# Altium integrated library LEMO Unipole And Multipole Type Connectors.IntLib: 1566 symbols (part 2 of 13)
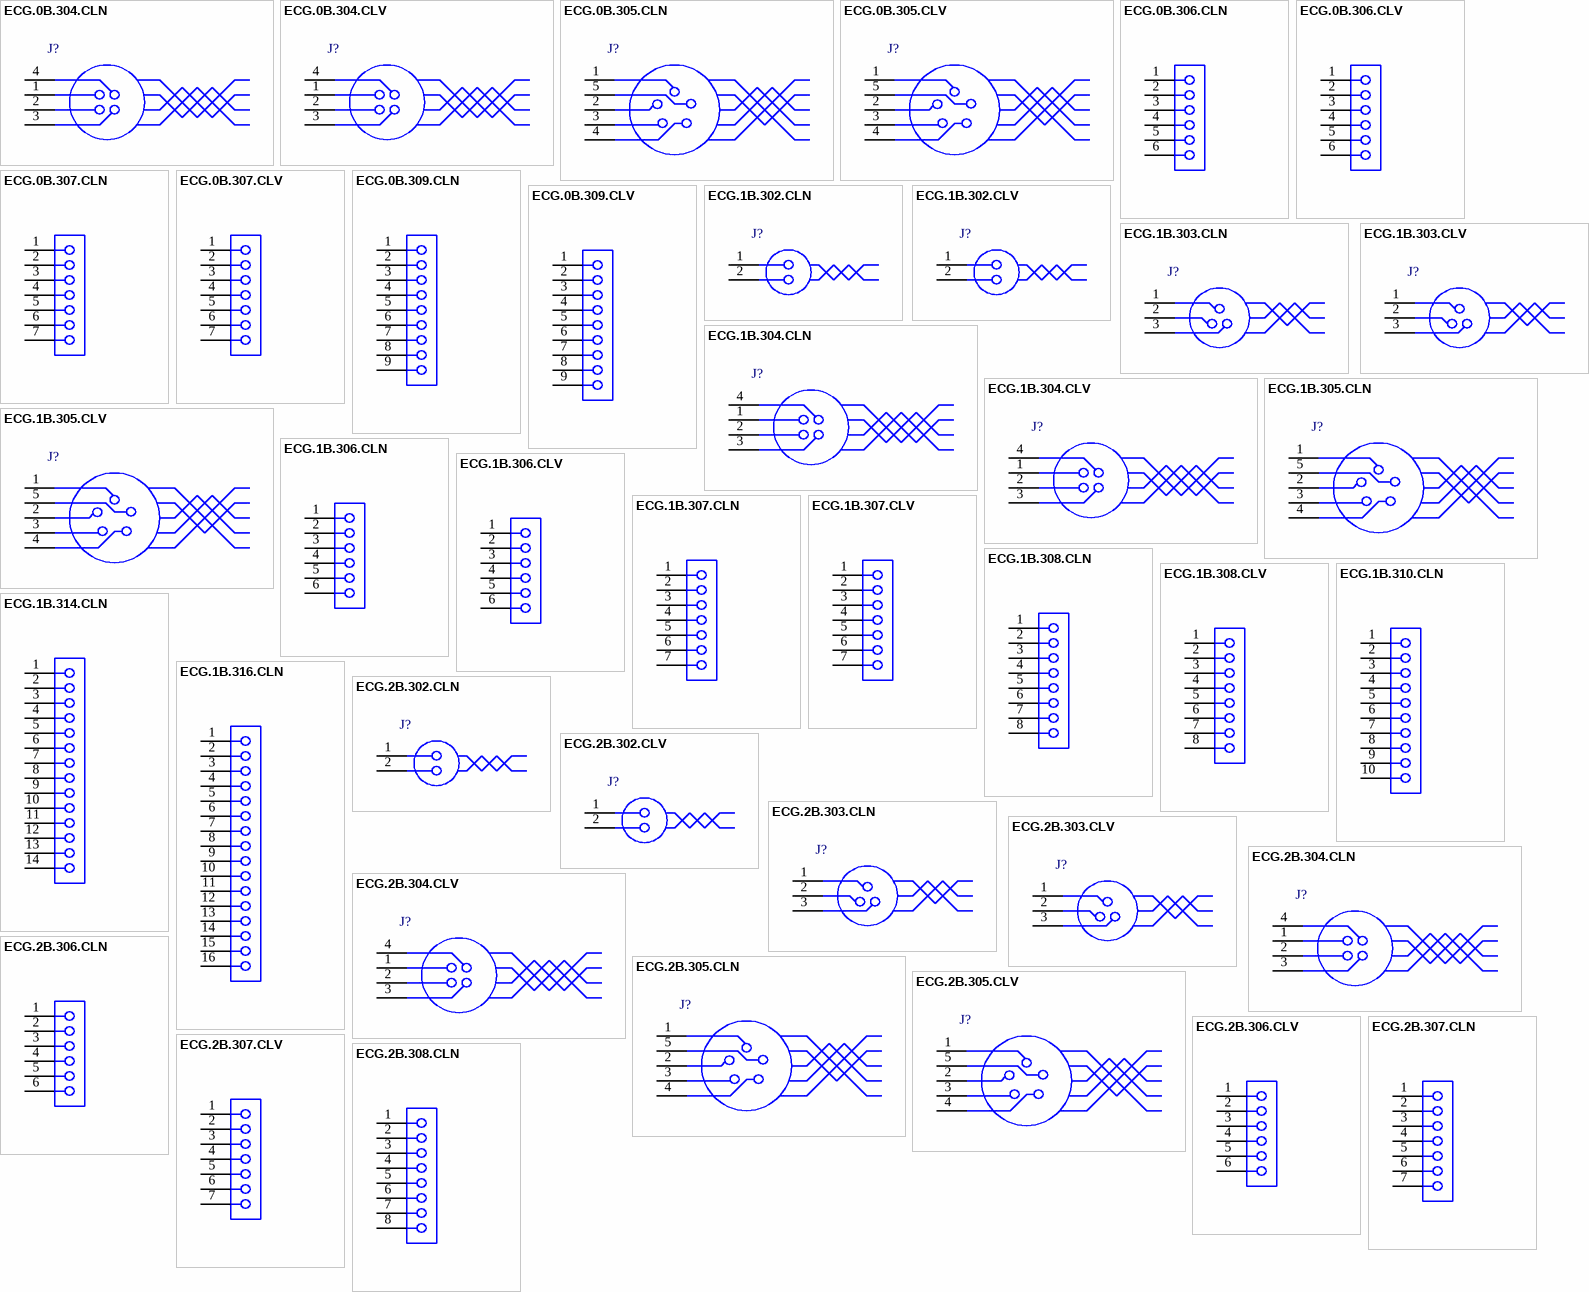
[diagram p44: symbols ECG.0B.304.CLN to ECG.2B.308.CLN]

## ECG.2B.308.CLN
designator J?
Fixed receptacle with two nuts and straight contact for printed circuit (back panel mounting), Key (G), 2B series, Multipole Type with 8 Contacts; Manufacturer: LEMO; PartNumber: ECG.2B.308.CLN; Number of contacts: 8; Contact Diameter: 0.9 mm; AWG: 22; Rated Current(A): 10; DatasheetVersion: Jun-14; PackageReference: ECG.2B.308.CLN; PackageDescription: Fixed receptacle with two nuts and straight contact for printed circuit (back panel mounting), Key(G) for Printed Circuit; Supplier 1: Mouser; Supplier Part Number 1: 736-ECG2B308CLN; Supplier 2: Digi-Key; Supplier Part Number 2: ECG.2B.308.CLN-ND; ComponentLink1Description: Manufacturer URL; ComponentLink1URL: http://www.lemo.com; ComponentLink2Description: Datasheet; ComponentLink2URL: http://intra.lemo.ch/catalog/ROW/UK_English/unipole_multipole.pdf
footprint ECG.2B.308.CLN (Socket, Female, Body 15mm dia. Height 21.8 mm, Through hole)
pins: 1, 2, 3, 4, 5, 6, 7, 8

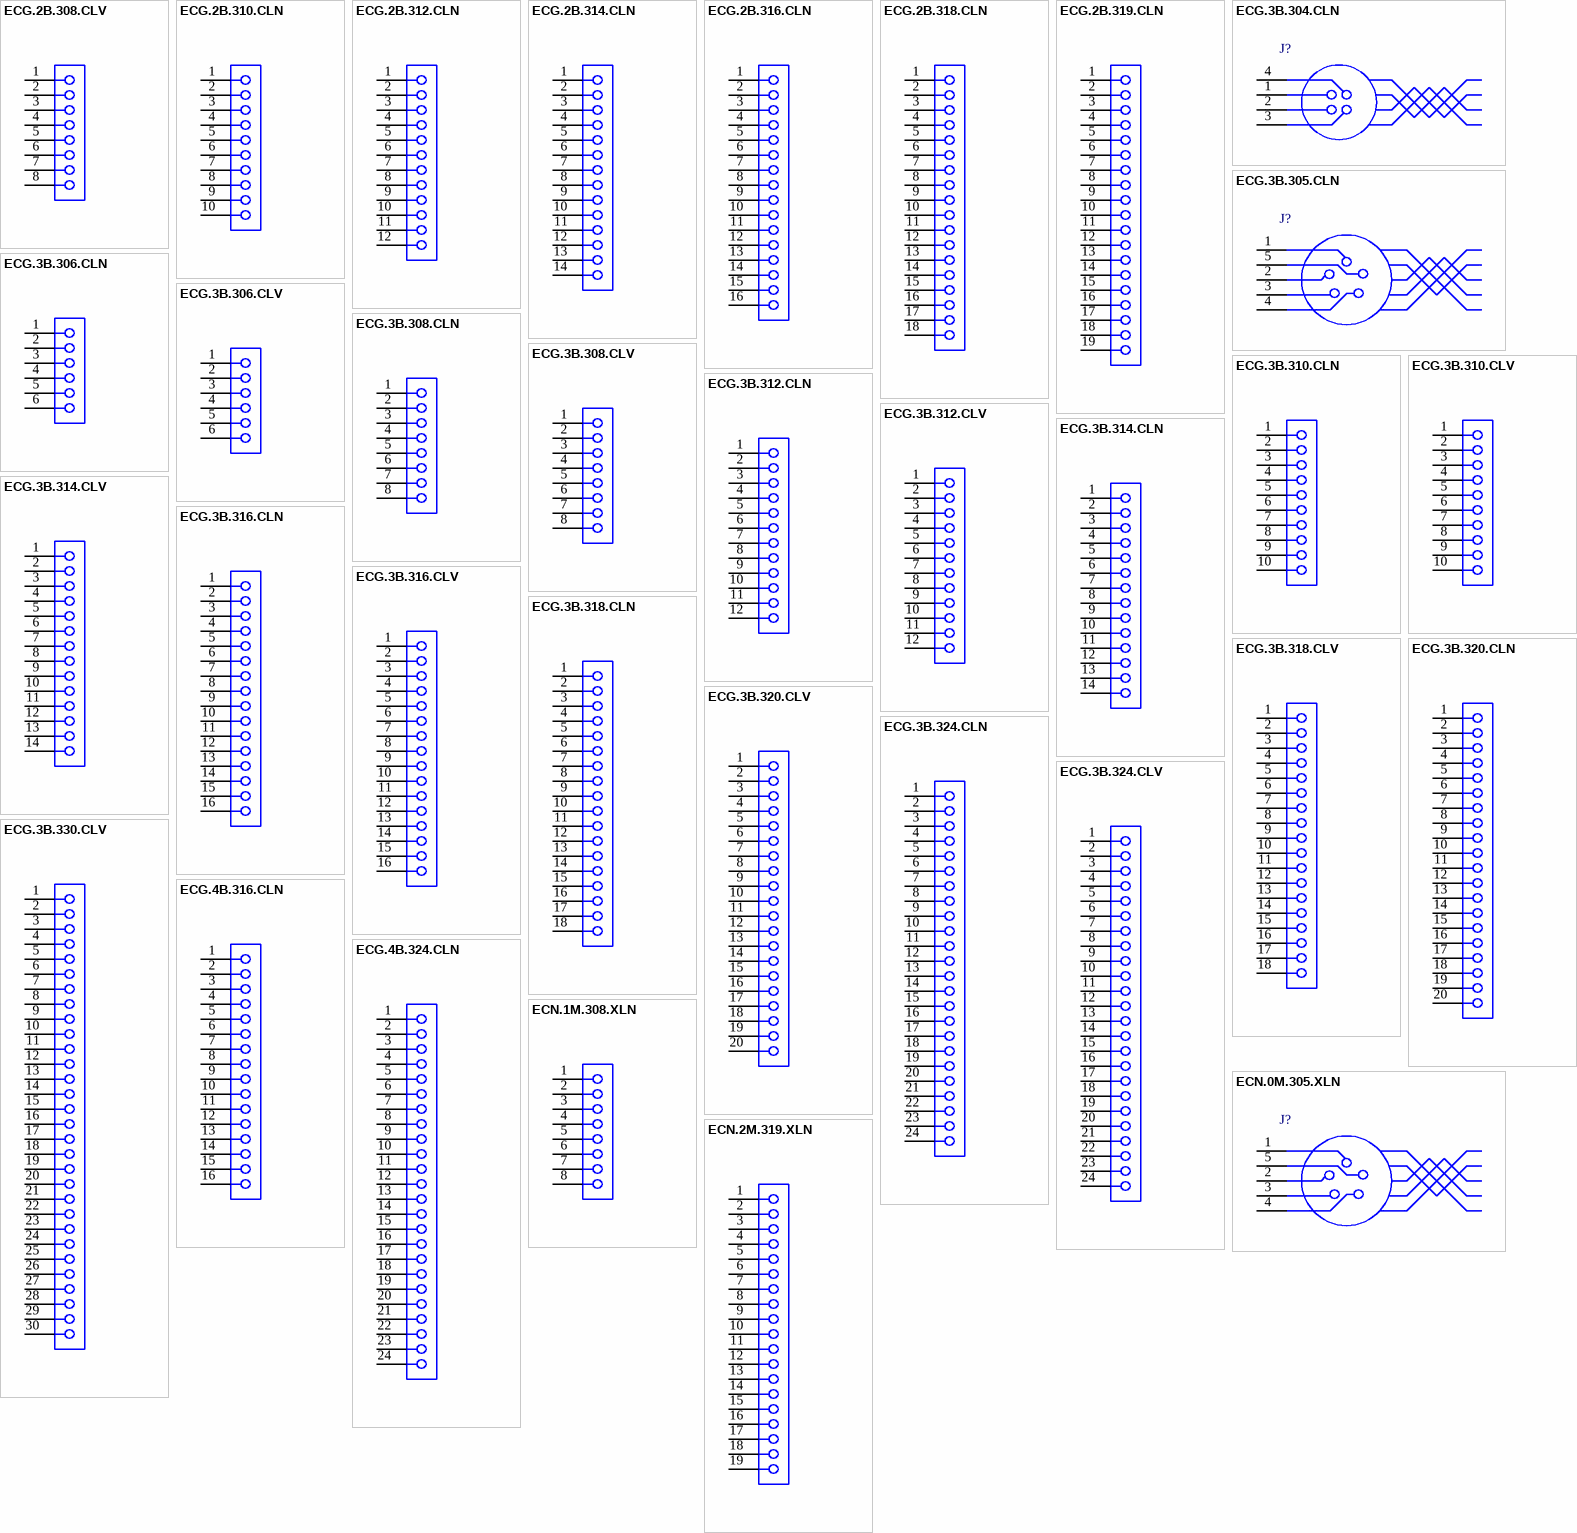
[diagram p3: symbols ECG.2B.308.CLV to ECN.2M.319.XLN]

## ECG.2B.308.CLV
designator J?
Fixed receptacle with two nuts, with elbow contact for printed circuit (back panel mounting), Key (G), 2B series, Multipole Type with 8 Contacts; Manufacturer: LEMO; PartNumber: ECG.2B.308.CLV; Number of contacts: 8; Contact Diameter: 0.9 mm; AWG: 22; Rated Current(A): 6; DatasheetVersion: Jun-14; PackageReference: ECG.2B.308.CLV; PackageDescription: Fixed receptacle with two nuts, with elbow contact for printed circuit (back panel mounting), Key(G) for Printed Circuit; Supplier 1: Mouser; Supplier Part Number 1: 736-ECG2B308CLV; Supplier 2: Digi-Key; Supplier Part Number 2: ECG.2B.308.CLV-ND; ComponentLink1Description: Manufacturer URL; ComponentLink1URL: http://www.lemo.com; ComponentLink2Description: Datasheet; ComponentLink2URL: http://intra.lemo.ch/catalog/ROW/UK_English/unipole_multipole.pdf
footprint ECG.2B.308.CLV (Socket, Female, Body 15mm dia. Height 22.3 mm, Through hole)
pins: 1, 2, 3, 4, 5, 6, 7, 8

## ECG.2B.310.CLN
designator J?
Fixed receptacle with two nuts and straight contact for printed circuit (back panel mounting), Key (G), 2B series, Multipole Type with 10 Contacts; Manufacturer: LEMO; PartNumber: ECG.2B.310.CLN; Number of contacts: 10; Contact Diameter: 0.9 mm; AWG: 22; Rated Current(A): 8; DatasheetVersion: Jun-14; PackageReference: ECG.2B.310.CLN; PackageDescription: Fixed receptacle with two nuts and straight contact for printed circuit (back panel mounting), Key(G) for Printed Circuit; Supplier 1: Mouser; Supplier Part Number 1: 736-ECG2B310CLN; Supplier 2: Newark; Supplier Part Number 2: 39Y5113; Supplier 3: Digi-Key; Supplier Part Number 3: 1124-1329-ND; ComponentLink1Description: Manufacturer URL; ComponentLink1URL: http://www.lemo.com; ComponentLink2Description: Datasheet; ComponentLink2URL: http://intra.lemo.ch/catalog/ROW/UK_English/unipole_multipole.pdf
footprint ECG.2B.310.CLN (Socket, Female, Body 15mm dia. Height 21.8 mm, Through hole)
pins: 1, 2, 3, 4, 5, 6, 7, 8, 9, 10

## ECG.2B.312.CLN
designator J?
Fixed receptacle with two nuts and straight contact for printed circuit (back panel mounting), Key (G), 2B series, Multipole Type with 12 Contacts; Manufacturer: LEMO; PartNumber: ECG.2B.312.CLN; Number of contacts: 12; Contact Diameter: 0.7 mm; AWG: 24; Rated Current(A): 7; DatasheetVersion: Jun-14; PackageReference: ECG.2B.312.CLN; PackageDescription: Fixed receptacle with two nuts and straight contact for printed circuit (back panel mounting), Key(G) for Printed Circuit; Supplier 1: Mouser; Supplier Part Number 1: 736-ECG2B312CLN; Supplier 2: Digi-Key; Supplier Part Number 2: 1124-1330-ND; ComponentLink1Description: Manufacturer URL; ComponentLink1URL: http://www.lemo.com; ComponentLink2Description: Datasheet; ComponentLink2URL: http://intra.lemo.ch/catalog/ROW/UK_English/unipole_multipole.pdf
footprint ECG.2B.312.CLN (Socket, Female, Body 15mm dia. Height 21.8 mm, Through hole)
pins: 1, 2, 3, 4, 5, 6, 7, 8, 9, 10, 11, 12

## ECG.2B.314.CLN
designator J?
Fixed receptacle with two nuts and straight contact for printed circuit (back panel mounting), Key (G), 2B series, Multipole Type with 14 Contacts; Manufacturer: LEMO; PartNumber: ECG.2B.314.CLN; Number of contacts: 14; Contact Diameter: 0.7 mm; AWG: 24; Rated Current(A): 6.5; DatasheetVersion: Jun-14; PackageReference: ECG.2B.314.CLN; PackageDescription: Fixed receptacle with two nuts and straight contact for printed circuit (back panel mounting), Key(G) for Printed Circuit; Supplier 1: Mouser; Supplier Part Number 1: 736-ECG2B314CLN; Supplier 2: Digi-Key; Supplier Part Number 2: ECG.2B.314.CLN-ND; ComponentLink1Description: Manufacturer URL; ComponentLink1URL: http://www.lemo.com; ComponentLink2Description: Datasheet; ComponentLink2URL: http://intra.lemo.ch/catalog/ROW/UK_English/unipole_multipole.pdf
footprint ECG.2B.314.CLN (Socket, Female, Body 15mm dia. Height 21.8 mm, Through hole)
pins: 1, 2, 3, 4, 5, 6, 7, 8, 9, 10, 11, 12, 13, 14

## ECG.2B.316.CLN
designator J?
Fixed receptacle with two nuts and straight contact for printed circuit (back panel mounting), Key (G), 2B series, Multipole Type with 16 Contacts; Manufacturer: LEMO; PartNumber: ECG.2B.316.CLN; Number of contacts: 16; Contact Diameter: 0.7 mm; AWG: 24; Rated Current(A): 6; DatasheetVersion: Jun-14; PackageReference: ECG.2B.316.CLN; PackageDescription: Fixed receptacle with two nuts and straight contact for printed circuit (back panel mounting), Key(G) for Printed Circuit; Supplier 1: Mouser; Supplier Part Number 1: 736-ECG2B316CLN; Supplier 2: Digi-Key; Supplier Part Number 2: ECG.2B.316.CLN-ND; ComponentLink1Description: Manufacturer URL; ComponentLink1URL: http://www.lemo.com; ComponentLink2Description: Datasheet; ComponentLink2URL: http://intra.lemo.ch/catalog/ROW/UK_English/unipole_multipole.pdf
footprint ECG.2B.316.CLN (Socket, Female, Body 15mm dia. Height 21.8 mm, Through hole)
pins: 1, 2, 3, 4, 5, 6, 7, 8, 9, 10, 11, 12, 13, 14, 15, 16

## ECG.2B.318.CLN
designator J?
Fixed receptacle with two nuts and straight contact for printed circuit (back panel mounting), Key (G), 2B series, Multipole Type with 18 Contacts; Manufacturer: LEMO; PartNumber: ECG.2B.318.CLN; Number of contacts: 18; Contact Diameter: 0.7 mm; AWG: 24; Rated Current(A): 5.5; DatasheetVersion: Jun-14; PackageReference: ECG.2B.318.CLN; PackageDescription: Fixed receptacle with two nuts and straight contact for printed circuit (back panel mounting), Key(G) for Printed Circuit; Supplier 1: Mouser; Supplier Part Number 1: 736-ECG2B318CLN; Supplier 2: Digi-Key; Supplier Part Number 2: ECG.2B.318.CLN-ND; ComponentLink1Description: Manufacturer URL; ComponentLink1URL: http://www.lemo.com; ComponentLink2Description: Datasheet; ComponentLink2URL: http://intra.lemo.ch/catalog/ROW/UK_English/unipole_multipole.pdf
footprint ECG.2B.318.CLN (Socket, Female, Body 15mm dia. Height 21.8 mm, Through hole)
pins: 1, 2, 3, 4, 5, 6, 7, 8, 9, 10, 11, 12, 13, 14, 15, 16, 17, 18

## ECG.2B.319.CLN
designator J?
Fixed receptacle with two nuts and straight contact for printed circuit (back panel mounting), Key (G), 2B series, Multipole Type with 19 Contacts; Manufacturer: LEMO; PartNumber: ECG.2B.319.CLN; Number of contacts: 19; Contact Diameter: 0.7 mm; AWG: 24; Rated Current(A): 5; DatasheetVersion: Jun-14; PackageReference: ECG.2B.319.CLN; PackageDescription: Fixed receptacle with two nuts and straight contact for printed circuit (back panel mounting), Key(G) for Printed Circuit; Supplier 1: Mouser; Supplier Part Number 1: 736-ECG2B319CLN; Supplier 2: Digi-Key; Supplier Part Number 2: ECG.2B.319.CLN-ND; ComponentLink1Description: Manufacturer URL; ComponentLink1URL: http://www.lemo.com; ComponentLink2Description: Datasheet; ComponentLink2URL: http://intra.lemo.ch/catalog/ROW/UK_English/unipole_multipole.pdf
footprint ECG.2B.319.CLN (Socket, Female, Body 15mm dia. Height 21.8 mm, Through hole)
pins: 1, 2, 3, 4, 5, 6, 7, 8, 9, 10, 11, 12, 13, 14, 15, 16, 17, 18, 19

## ECG.3B.304.CLN
designator J?
Fixed receptacle with two nuts and straight contact for printed circuit (back panel mounting), Key (G), 3B series, Multipole Type with 4 Contacts; Manufacturer: LEMO; PartNumber: ECG.3B.304.CLN; Number of contacts: 4; Contact Diameter: 2 mm; AWG: 14; Rated Current(A): 19; DatasheetVersion: Jun-14; PackageReference: ECG.3B.304.CLN; PackageDescription: Fixed receptacle with two nuts and straight contact for printed circuit (back panel mounting), Key(G) for Printed Circuit; Supplier 1: Mouser; Supplier Part Number 1: 736-ECG3B304CLN; Supplier 2: Digi-Key; Supplier Part Number 2: ECG.3B.304.CLN-ND; ComponentLink1Description: Manufacturer URL; ComponentLink1URL: http://www.lemo.com; ComponentLink2Description: Datasheet; ComponentLink2URL: http://intra.lemo.ch/catalog/ROW/UK_English/unipole_multipole.pdf
footprint ECG.3B.304.CLN (Socket, Female, Body 18mm dia. Height 25.8 mm, Through hole)
pins: 1, 2, 3, 4

## ECG.3B.305.CLN
designator J?
Fixed receptacle with two nuts and straight contact for printed circuit (back panel mounting), Key (G), 3B series, Multipole Type with 5 Contacts; Manufacturer: LEMO; PartNumber: ECG.3B.305.CLN; Number of contacts: 5; Contact Diameter: 1.6 mm; AWG: 16; Rated Current(A): 19; DatasheetVersion: Jun-14; PackageReference: ECG.3B.305.CLN; PackageDescription: Fixed receptacle with two nuts and straight contact for printed circuit (back panel mounting), Key(G) for Printed Circuit; ComponentLink1Description: Manufacturer URL; ComponentLink1URL: http://www.lemo.com; ComponentLink2Description: Datasheet; ComponentLink2URL: http://intra.lemo.ch/catalog/ROW/UK_English/unipole_multipole.pdf
footprint ECG.3B.305.CLN (Socket, Female, Body 18mm dia. Height 25.8 mm, Through hole)
pins: 1, 2, 3, 4, 5

## ECG.3B.306.CLN
designator J?
Fixed receptacle with two nuts and straight contact for printed circuit (back panel mounting), Key (G), 3B series, Multipole Type with 6 Contacts; Manufacturer: LEMO; PartNumber: ECG.3B.306.CLN; Number of contacts: 6; Contact Diameter: 1.6 mm; AWG: 16; Rated Current(A): 17; DatasheetVersion: Jun-14; PackageReference: ECG.3B.306.CLN; PackageDescription: Fixed receptacle with two nuts and straight contact for printed circuit (back panel mounting), Key(G) for Printed Circuit; ComponentLink1Description: Manufacturer URL; ComponentLink1URL: http://www.lemo.com; ComponentLink2Description: Datasheet; ComponentLink2URL: http://intra.lemo.ch/catalog/ROW/UK_English/unipole_multipole.pdf
footprint ECG.3B.306.CLN (Socket, Female, Body 18mm dia. Height 25.8 mm, Through hole)
pins: 1, 2, 3, 4, 5, 6

## ECG.3B.306.CLV
designator J?
Fixed receptacle with two nuts, with elbow contact for printed circuit (back panel mounting), Key (G), 3B series, Multipole Type with 6 Contacts; Manufacturer: LEMO; PartNumber: ECG.3B.306.CLV; Number of contacts: 6; Contact Diameter: 1.6 mm; AWG: 16; Rated Current(A): 0; DatasheetVersion: Jun-14; PackageReference: ECG.3B.306.CLV; PackageDescription: Fixed receptacle with two nuts, with elbow contact for printed circuit (back panel mounting), Key(G) for Printed Circuit; ComponentLink1Description: Manufacturer URL; ComponentLink1URL: http://www.lemo.com; ComponentLink2Description: Datasheet; ComponentLink2URL: http://intra.lemo.ch/catalog/ROW/UK_English/unipole_multipole.pdf
footprint ECG.3B.306.CLV (Socket, Female, Body 18mm dia. Height 25.8 mm, Through hole)
pins: 1, 2, 3, 4, 5, 6

## ECG.3B.308.CLN
designator J?
Fixed receptacle with two nuts and straight contact for printed circuit (back panel mounting), Key (G), 3B series, Multipole Type with 8 Contacts; Manufacturer: LEMO; PartNumber: ECG.3B.308.CLN; Number of contacts: 8; Contact Diameter: 1.3 mm; AWG: 20; Rated Current(A): 13; DatasheetVersion: Jun-14; PackageReference: ECG.3B.308.CLN; PackageDescription: Fixed receptacle with two nuts and straight contact for printed circuit (back panel mounting), Key(G) for Printed Circuit; Supplier 1: Mouser; Supplier Part Number 1: 736-ECG3B308CLN; Supplier 2: Digi-Key; Supplier Part Number 2: ECG.3B.308.CLN-ND; ComponentLink1Description: Manufacturer URL; ComponentLink1URL: http://www.lemo.com; ComponentLink2Description: Datasheet; ComponentLink2URL: http://intra.lemo.ch/catalog/ROW/UK_English/unipole_multipole.pdf
footprint ECG.3B.308.CLN (Socket, Female, Body 18mm dia. Height 25.8 mm, Through hole)
pins: 1, 2, 3, 4, 5, 6, 7, 8

## ECG.3B.308.CLV
designator J?
Fixed receptacle with two nuts, with elbow contact for printed circuit (back panel mounting), Key (G), 3B series, Multipole Type with 8 Contacts; Manufacturer: LEMO; PartNumber: ECG.3B.308.CLV; Number of contacts: 8; Contact Diameter: 1.3 mm; AWG: 20; Rated Current(A): 0; DatasheetVersion: Jun-14; PackageReference: ECG.3B.308.CLV; PackageDescription: Fixed receptacle with two nuts, with elbow contact for printed circuit (back panel mounting), Key(G) for Printed Circuit; Supplier 1: Mouser; Supplier Part Number 1: 736-ECG.3B.308.CLV; Supplier 2: Digi-Key; Supplier Part Number 2: ECG.3B.308.CLV-ND; ComponentLink1Description: Manufacturer URL; ComponentLink1URL: http://www.lemo.com; ComponentLink2Description: Datasheet; ComponentLink2URL: http://intra.lemo.ch/catalog/ROW/UK_English/unipole_multipole.pdf
footprint ECG.3B.308.CLV (Socket, Female, Body 18mm dia. Height 25.8 mm, Through hole)
pins: 1, 2, 3, 4, 5, 6, 7, 8

## ECG.3B.310.CLN
designator J?
Fixed receptacle with two nuts and straight contact for printed circuit (back panel mounting), Key (G), 3B series, Multipole Type with 10 Contacts; Manufacturer: LEMO; PartNumber: ECG.3B.310.CLN; Number of contacts: 10; Contact Diameter: 1.3 mm; AWG: 20; Rated Current(A): 12; DatasheetVersion: Jun-14; PackageReference: ECG.3B.310.CLN; PackageDescription: Fixed receptacle with two nuts and straight contact for printed circuit (back panel mounting), Key(G) for Printed Circuit; Supplier 1: Mouser; Supplier Part Number 1: 736-ECG3B310CLN; Supplier 2: Digi-Key; Supplier Part Number 2: ECG.3B.310.CLN-ND; ComponentLink1Description: Manufacturer URL; ComponentLink1URL: http://www.lemo.com; ComponentLink2Description: Datasheet; ComponentLink2URL: http://intra.lemo.ch/catalog/ROW/UK_English/unipole_multipole.pdf
footprint ECG.3B.310.CLN (Socket, Female, Body 18mm dia. Height 25.8 mm, Through hole)
pins: 1, 2, 3, 4, 5, 6, 7, 8, 9, 10

## ECG.3B.310.CLV
designator J?
Fixed receptacle with two nuts, with elbow contact for printed circuit (back panel mounting), Key (G), 3B series, Multipole Type with 10 Contacts; Manufacturer: LEMO; PartNumber: ECG.3B.310.CLV; Number of contacts: 10; Contact Diameter: 1.3 mm; AWG: 20; Rated Current(A): 0; DatasheetVersion: Jun-14; PackageReference: ECG.3B.310.CLV; PackageDescription: Fixed receptacle with two nuts, with elbow contact for printed circuit (back panel mounting), Key(G) for Printed Circuit; Supplier 1: Mouser; Supplier Part Number 1: 736-ECG3B310CLV; Supplier 2: Digi-Key; Supplier Part Number 2: ECG.3B.310.CLV-ND; ComponentLink1Description: Manufacturer URL; ComponentLink1URL: http://www.lemo.com; ComponentLink2Description: Datasheet; ComponentLink2URL: http://intra.lemo.ch/catalog/ROW/UK_English/unipole_multipole.pdf
footprint ECG.3B.310.CLV (Socket, Female, Body 18mm dia. Height 25.8 mm, Through hole)
pins: 1, 2, 3, 4, 5, 6, 7, 8, 9, 10

## ECG.3B.312.CLN
designator J?
Fixed receptacle with two nuts and straight contact for printed circuit (back panel mounting), Key (G), 3B series, Multipole Type with 12 Contacts; Manufacturer: LEMO; PartNumber: ECG.3B.312.CLN; Number of contacts: 12; Contact Diameter: 0.9 mm; AWG: 22; Rated Current(A): 9; DatasheetVersion: Jun-14; PackageReference: ECG.3B.312.CLN; PackageDescription: Fixed receptacle with two nuts and straight contact for printed circuit (back panel mounting), Key(G) for Printed Circuit; Supplier 1: Mouser; Supplier Part Number 1: 736-ECG3B312CLN; Supplier 2: Digi-Key; Supplier Part Number 2: ECG.3B.312.CLN-ND; ComponentLink1Description: Manufacturer URL; ComponentLink1URL: http://www.lemo.com; ComponentLink2Description: Datasheet; ComponentLink2URL: http://intra.lemo.ch/catalog/ROW/UK_English/unipole_multipole.pdf
footprint ECG.3B.312.CLN (Socket, Female, Body 18mm dia. Height 25.8 mm, Through hole)
pins: 1, 2, 3, 4, 5, 6, 7, 8, 9, 10, 11, 12

## ECG.3B.312.CLV
designator J?
Fixed receptacle with two nuts, with elbow contact for printed circuit (back panel mounting), Key (G), 3B series, Multipole Type with 12 Contacts; Manufacturer: LEMO; PartNumber: ECG.3B.312.CLV; Number of contacts: 12; Contact Diameter: 0.9 mm; AWG: 22; Rated Current(A): 0; DatasheetVersion: Jun-14; PackageReference: ECG.3B.312.CLV; PackageDescription: Fixed receptacle with two nuts, with elbow contact for printed circuit (back panel mounting), Key(G) for Printed Circuit; Supplier 1: Mouser; Supplier Part Number 1: 736-ECG3B312CLV; Supplier 2: Digi-Key; Supplier Part Number 2: ECG.3B.312.CLV-ND; ComponentLink1Description: Manufacturer URL; ComponentLink1URL: http://www.lemo.com; ComponentLink2Description: Datasheet; ComponentLink2URL: http://intra.lemo.ch/catalog/ROW/UK_English/unipole_multipole.pdf
footprint ECG.3B.312.CLV (Socket, Female, Body 18mm dia. Height 25.8 mm, Through hole)
pins: 1, 2, 3, 4, 5, 6, 7, 8, 9, 10, 11, 12

## ECG.3B.314.CLN
designator J?
Fixed receptacle with two nuts and straight contact for printed circuit (back panel mounting), Key (G), 3B series, Multipole Type with 14 Contacts; Manufacturer: LEMO; PartNumber: ECG.3B.314.CLN; Number of contacts: 14; Contact Diameter: 0.9 mm; AWG: 22; Rated Current(A): 9; DatasheetVersion: Jun-14; PackageReference: ECG.3B.314.CLN; PackageDescription: Fixed receptacle with two nuts and straight contact for printed circuit (back panel mounting), Key(G) for Printed Circuit; Supplier 1: Mouser; Supplier Part Number 1: 736-ECG3B314CLN; Supplier 2: Digi-Key; Supplier Part Number 2: ECG.3B.314.CLN-ND; ComponentLink1Description: Manufacturer URL; ComponentLink1URL: http://www.lemo.com; ComponentLink2Description: Datasheet; ComponentLink2URL: http://intra.lemo.ch/catalog/ROW/UK_English/unipole_multipole.pdf
footprint ECG.3B.314.CLN (Socket, Female, Body 18mm dia. Height 25.8 mm, Through hole)
pins: 1, 2, 3, 4, 5, 6, 7, 8, 9, 10, 11, 12, 13, 14

## ECG.3B.314.CLV
designator J?
Fixed receptacle with two nuts, with elbow contact for printed circuit (back panel mounting), Key (G), 3B series, Multipole Type with 14 Contacts; Manufacturer: LEMO; PartNumber: ECG.3B.314.CLV; Number of contacts: 14; Contact Diameter: 0.9 mm; AWG: 22; Rated Current(A): 6; DatasheetVersion: Jun-14; PackageReference: ECG.3B.314.CLV; PackageDescription: Fixed receptacle with two nuts, with elbow contact for printed circuit (back panel mounting), Key(G) for Printed Circuit; Supplier 1: Mouser; Supplier Part Number 1: 736-ECG3B314CLV; Supplier 2: Digi-Key; Supplier Part Number 2: ECG.3B.314.CLV-ND; ComponentLink1Description: Manufacturer URL; ComponentLink1URL: http://www.lemo.com; ComponentLink2Description: Datasheet; ComponentLink2URL: http://intra.lemo.ch/catalog/ROW/UK_English/unipole_multipole.pdf
footprint ECG.3B.314.CLV (Socket, Female, Body 18mm dia. Height 25.8 mm, Through hole)
pins: 1, 2, 3, 4, 5, 6, 7, 8, 9, 10, 11, 12, 13, 14

## ECG.3B.316.CLN
designator J?
Fixed receptacle with two nuts and straight contact for printed circuit (back panel mounting), Key (G), 3B series, Multipole Type with 16 Contacts; Manufacturer: LEMO; PartNumber: ECG.3B.316.CLN; Number of contacts: 16; Contact Diameter: 0.9 mm; AWG: 22; Rated Current(A): 8; DatasheetVersion: Jun-14; PackageReference: ECG.3B.316.CLN; PackageDescription: Fixed receptacle with two nuts and straight contact for printed circuit (back panel mounting), Key(G) for Printed Circuit; Supplier 1: Mouser; Supplier Part Number 1: 736-ECG3B316CLN; Supplier 2: Digi-Key; Supplier Part Number 2: ECG.3B.316.CLN-ND; ComponentLink1Description: Manufacturer URL; ComponentLink1URL: http://www.lemo.com; ComponentLink2Description: Datasheet; ComponentLink2URL: http://intra.lemo.ch/catalog/ROW/UK_English/unipole_multipole.pdf
footprint ECG.3B.316.CLN (Socket, Female, Body 18mm dia. Height 25.8 mm, Through hole)
pins: 1, 2, 3, 4, 5, 6, 7, 8, 9, 10, 11, 12, 13, 14, 15, 16

## ECG.3B.316.CLV
designator J?
Fixed receptacle with two nuts, with elbow contact for printed circuit (back panel mounting), Key (G), 3B series, Multipole Type with 16 Contacts; Manufacturer: LEMO; PartNumber: ECG.3B.316.CLV; Number of contacts: 16; Contact Diameter: 0.9 mm; AWG: 22; Rated Current(A): 0; DatasheetVersion: Jun-14; PackageReference: ECG.3B.316.CLV; PackageDescription: Fixed receptacle with two nuts, with elbow contact for printed circuit (back panel mounting), Key(G) for Printed Circuit; Supplier 1: Mouser; Supplier Part Number 1: 736-ECG3B316CLV; Supplier 2: Digi-Key; Supplier Part Number 2: ECG.3B.316.CLV-ND; ComponentLink1Description: Manufacturer URL; ComponentLink1URL: http://www.lemo.com; ComponentLink2Description: Datasheet; ComponentLink2URL: http://intra.lemo.ch/catalog/ROW/UK_English/unipole_multipole.pdf
footprint ECG.3B.316.CLV (Socket, Female, Body 18mm dia. Height 25.8 mm, Through hole)
pins: 1, 2, 3, 4, 5, 6, 7, 8, 9, 10, 11, 12, 13, 14, 15, 16

## ECG.3B.318.CLN
designator J?
Fixed receptacle with two nuts and straight contact for printed circuit (back panel mounting), Key (G), 3B series, Multipole Type with 18 Contacts; Manufacturer: LEMO; PartNumber: ECG.3B.318.CLN; Number of contacts: 18; Contact Diameter: 0.9 mm; AWG: 22; Rated Current(A): 7; DatasheetVersion: Jun-14; PackageReference: ECG.3B.318.CLN; PackageDescription: Fixed receptacle with two nuts and straight contact for printed circuit (back panel mounting), Key(G) for Printed Circuit; Supplier 1: Mouser; Supplier Part Number 1: 736-ECG3B318CLN; Supplier 2: Digi-Key; Supplier Part Number 2: ECG.3B.318.CLN-ND; ComponentLink1Description: Manufacturer URL; ComponentLink1URL: http://www.lemo.com; ComponentLink2Description: Datasheet; ComponentLink2URL: http://intra.lemo.ch/catalog/ROW/UK_English/unipole_multipole.pdf
footprint ECG.3B.318.CLN (Socket, Female, Body 18mm dia. Height 25.8 mm, Through hole)
pins: 1, 2, 3, 4, 5, 6, 7, 8, 9, 10, 11, 12, 13, 14, 15, 16, 17, 18

## ECG.3B.318.CLV
designator J?
Fixed receptacle with two nuts, with elbow contact for printed circuit (back panel mounting), Key (G), 3B series, Multipole Type with 18 Contacts; Manufacturer: LEMO; PartNumber: ECG.3B.318.CLV; Number of contacts: 18; Contact Diameter: 0.9 mm; AWG: 22; Rated Current(A): 0; DatasheetVersion: Jun-14; PackageReference: ECG.3B.318.CLV; PackageDescription: Fixed receptacle with two nuts, with elbow contact for printed circuit (back panel mounting), Key(G) for Printed Circuit; Supplier 1: Mouser; Supplier Part Number 1: 736-ECG3B318CLV; Supplier 2: Digi-Key; Supplier Part Number 2: ECG.3B.318.CLV-ND; ComponentLink1Description: Manufacturer URL; ComponentLink1URL: http://www.lemo.com; ComponentLink2Description: Datasheet; ComponentLink2URL: http://intra.lemo.ch/catalog/ROW/UK_English/unipole_multipole.pdf
footprint ECG.3B.318.CLV (Socket, Female, Body 18mm dia. Height 25.8 mm, Through hole)
pins: 1, 2, 3, 4, 5, 6, 7, 8, 9, 10, 11, 12, 13, 14, 15, 16, 17, 18

## ECG.3B.320.CLN
designator J?
Fixed receptacle with two nuts and straight contact for printed circuit (back panel mounting), Key (G), 3B series, Multipole Type with 20 Contacts; Manufacturer: LEMO; PartNumber: ECG.3B.320.CLN; Number of contacts: 20; Contact Diameter: 0.7 mm; AWG: 24; Rated Current(A): 6; DatasheetVersion: Jun-14; PackageReference: ECG.3B.320.CLN; PackageDescription: Fixed receptacle with two nuts and straight contact for printed circuit (back panel mounting), Key(G) for Printed Circuit; Supplier 1: Mouser; Supplier Part Number 1: 736-ECG3B320CLN; Supplier 2: Digi-Key; Supplier Part Number 2: ECG.3B.320.CLN-ND; ComponentLink1Description: Manufacturer URL; ComponentLink1URL: http://www.lemo.com; ComponentLink2Description: Datasheet; ComponentLink2URL: http://intra.lemo.ch/catalog/ROW/UK_English/unipole_multipole.pdf
footprint ECG.3B.320.CLN (Socket, Female, Body 18mm dia. Height 25.8 mm, Through hole)
pins: 1, 2, 3, 4, 5, 6, 7, 8, 9, 10, 11, 12, 13, 14, 15, 16, 17, 18, 19, 20
